# Altium footprint library WR-TBL_Pluggable PCB Header.PcbLib: 719 footprints (part 17 of 45)
Each footprint in its own frame and in the unit in brackets; x right, y up, seen from the top. Pads: shape width x height; smd on the part's side, far side on the other; paste and mask are expansions set on the pad; w line width, h text height; cw(c..) or ccw(c..) is an arc to the next point about the centre after c.
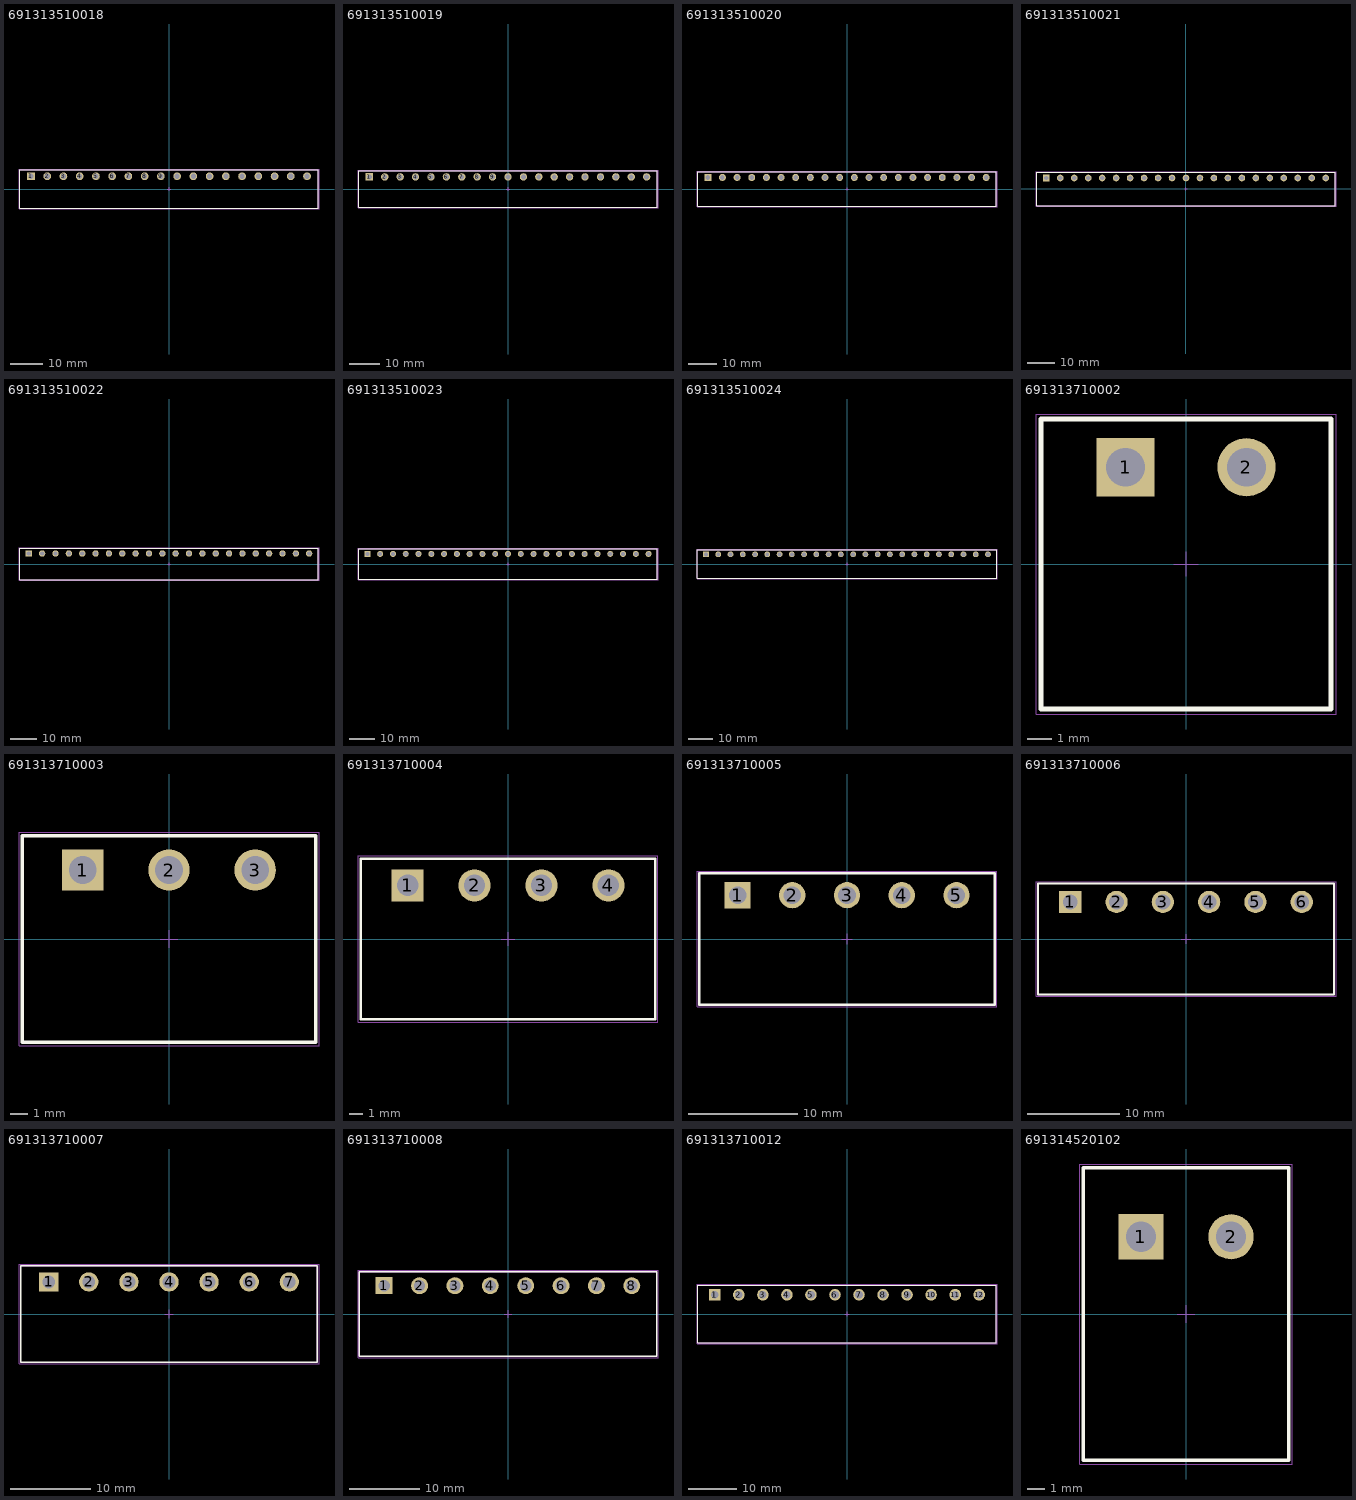
[diagram p16: the footprints below, top view; thin cyan lines are the x and y axes]

## 691313510018 [mm] "5,08mm - PCB Headers - Horizontal - Closed ends - 18p"
height 8.5
pads (18):
  rect 2.4x2.4 hole 1.6: 1(-43.18,4)
  round 2.4 hole 1.6: 2(-38.1,4) 3(-33.02,4) 4(-27.94,4) 5(-22.86,4) 6(-17.78,4) 7(-12.7,4) 8(-7.62,4) 9(-2.54,4) 10(2.54,4) 11(7.62,4) 12(12.7,4) 13(17.78,4) 14(22.86,4) 15(27.94,4) 16(33.02,4) 17(38.1,4) 18(43.18,4)
Top Overlay:
  lines w0.2: -46.72,-6 46.72,-6 46.72,6 -46.72,6 -46.72,-6
Mechanical 13:
  lines w0.1: -46.72,-6 -46.72,6 46.72,6 46.72,-6 -46.72,-6
Mechanical 15:
  lines w0.05: -0.5,0 0.5,0 ; 0,-0.5 0,0.5 ; -46.92,-6.2 46.92,-6.2 46.92,6.2 -46.92,6.2 -46.92,-6.2
3D body "691313510018.stp": height 8.55, standoff -3.45, extent -46.72,-6 46.72,6

## 691313510019 [mm] "5,08mm - PCB Headers - Horizontal - Closed ends - 19p"
height 8.5
pads (19):
  rect 2.4x2.4 hole 1.6: 1(-45.72,4)
  round 2.4 hole 1.6: 2(-40.64,4) 3(-35.56,4) 4(-30.48,4) 5(-25.4,4) 6(-20.32,4) 7(-15.24,4) 8(-10.16,4) 9(-5.08,4) 10(0,4) 11(5.08,4) 12(10.16,4) 13(15.24,4) 14(20.32,4) 15(25.4,4) 16(30.48,4) 17(35.56,4) 18(40.64,4) 19(45.72,4)
Top Overlay:
  lines w0.2: -49.26,-6 49.26,-6 49.26,6 -49.26,6 -49.26,-6
Mechanical 13:
  lines w0.1: -49.26,-6 -49.26,6 49.26,6 49.26,-6 -49.26,-6
Mechanical 15:
  lines w0.05: -0.5,0 0.5,0 ; 0,-0.5 0,0.5 ; -49.46,-6.2 49.46,-6.2 49.46,6.2 -49.46,6.2 -49.46,-6.2
3D body "691313510019.stp": height 8.55, standoff -3.45, extent -49.26,-6 49.26,6

## 691313510020 [mm] "5,08mm - PCB Headers - Horizontal - Closed ends - 20p"
height 8.5
pads (20):
  rect 2.4x2.4 hole 1.6: 1(-48.26,4)
  round 2.4 hole 1.6: 2(-43.18,4) 3(-38.1,4) 4(-33.02,4) 5(-27.94,4) 6(-22.86,4) 7(-17.78,4) 8(-12.7,4) 9(-7.62,4) 10(-2.54,4) 11(2.54,4) 12(7.62,4) 13(12.7,4) 14(17.78,4) 15(22.86,4) 16(27.94,4) 17(33.02,4) 18(38.1,4) 19(43.18,4) 20(48.26,4)
Top Overlay:
  lines w0.2: -51.8,-6 51.8,-6 51.8,6 -51.8,6 -51.8,-6
Mechanical 13:
  lines w0.1: -51.8,-6 -51.8,6 51.8,6 51.8,-6 -51.8,-6
Mechanical 15:
  lines w0.05: -0.5,0 0.5,0 ; 0,-0.5 0,0.5 ; -52,-6.2 52,-6.2 52,6.2 -52,6.2 -52,-6.2
3D body "691313510020.stp": height 8.55, standoff -3.45, extent -51.8,-6 51.8,6

## 691313510021 [mm] "5,08mm - PCB Headers - Horizontal - Closed ends - 21p"
height 8.5
pads (21):
  rect 2.4x2.4 hole 1.6: 1(-50.8,4)
  round 2.4 hole 1.6: 2(-45.72,4) 3(-40.64,4) 4(-35.56,4) 5(-30.48,4) 6(-25.4,4) 7(-20.32,4) 8(-15.24,4) 9(-10.16,4) 10(-5.08,4) 11(0,4) 12(5.08,4) 13(10.16,4) 14(15.24,4) 15(20.32,4) 16(25.4,4) 17(30.48,4) 18(35.56,4) 19(40.64,4) 20(45.72,4) 21(50.8,4)
Top Overlay:
  lines w0.2: -54.34,-6 54.34,-6 54.34,6 -54.34,6 -54.34,-6
Mechanical 13:
  lines w0.1: -54.34,-6 -54.34,6 54.34,6 54.34,-6 -54.34,-6
Mechanical 15:
  lines w0.05: -0.5,0 0.5,0 ; 0,-0.5 0,0.5 ; -54.54,-6.2 54.54,-6.2 54.54,6.2 -54.54,6.2 -54.54,-6.2
3D body "691313510021.stp": height 8.55, standoff -3.45, extent -54.34,-6 54.34,6

## 691313510022 [mm] "5,08mm - PCB Headers - Horizontal - Closed ends - 22p"
height 8.5
pads (22):
  rect 2.4x2.4 hole 1.6: 1(-53.34,4)
  round 2.4 hole 1.6: 2(-48.26,4) 3(-43.18,4) 4(-38.1,4) 5(-33.02,4) 6(-27.94,4) 7(-22.86,4) 8(-17.78,4) 9(-12.7,4) 10(-7.62,4) 11(-2.54,4) 12(2.54,4) 13(7.62,4) 14(12.7,4) 15(17.78,4) 16(22.86,4) 17(27.94,4) 18(33.02,4) 19(38.1,4) 20(43.18,4) 21(48.26,4) 22(53.34,4)
Top Overlay:
  lines w0.2: -56.88,-6 56.88,-6 56.88,6 -56.88,6 -56.88,-6
Mechanical 13:
  lines w0.1: -56.88,-6 -56.88,6 56.88,6 56.88,-6 -56.88,-6
Mechanical 15:
  lines w0.05: -0.5,0 0.5,0 ; 0,-0.5 0,0.5 ; -57.08,-6.2 57.08,-6.2 57.08,6.2 -57.08,6.2 -57.08,-6.2
3D body "691313510022.stp": height 8.55, standoff -3.45, extent -56.88,-6 56.88,6

## 691313510023 [mm] "5,08mm - PCB Headers - Horizontal - Closed ends -23p"
height 8.5
pads (23):
  rect 2.4x2.4 hole 1.6: 1(-55.88,4)
  round 2.4 hole 1.6: 2(-50.8,4) 3(-45.72,4) 4(-40.64,4) 5(-35.56,4) 6(-30.48,4) 7(-25.4,4) 8(-20.32,4) 9(-15.24,4) 10(-10.16,4) 11(-5.08,4) 12(0,4) 13(5.08,4) 14(10.16,4) 15(15.24,4) 16(20.32,4) 17(25.4,4) 18(30.48,4) 19(35.56,4) 20(40.64,4) 21(45.72,4) 22(50.8,4) 23(55.88,4)
Top Overlay:
  lines w0.2: -59.42,-6 -59.42,6 59.42,6 59.42,-6 -59.42,-6
Mechanical 13:
  lines w0.1: -59.42,-6 59.42,-6 59.42,6 -59.42,6 -59.42,-6
Mechanical 15:
  lines w0.05: -0.5,0 0.5,0 ; 0,-0.5 0,0.5 ; -59.62,-6.2 -59.62,6.2 59.62,6.2 59.62,-6.2 -59.62,-6.2
3D body "691313510023.stp": height 8.55, standoff -3.45, extent -59.42,-6 59.42,6

## 691313510024 [mm] "5,08mm - PCB Headers - Horizontal - Closed ends - 24p"
height 8.5
pads (24):
  rect 2.4x2.4 hole 1.6: 1(-58.42,4)
  round 2.4 hole 1.6: 2(-53.34,4) 3(-48.26,4) 4(-43.18,4) 5(-38.1,4) 6(-33.02,4) 7(-27.94,4) 8(-22.86,4) 9(-17.78,4) 10(-12.7,4) 11(-7.62,4) 12(-2.54,4) 13(2.54,4) 14(7.62,4) 15(12.7,4) 16(17.78,4) 17(22.86,4) 18(27.94,4) 19(33.02,4) 20(38.1,4) 21(43.18,4) 22(48.26,4) 23(53.34,4) 24(58.42,4)
Top Overlay:
  lines w0.2: -61.96,-6 61.96,-6 61.96,6 -61.96,6 -61.96,-6
Mechanical 13:
  lines w0.1: -61.96,-6 -61.96,6 61.96,6 61.96,-6 -61.96,-6
Mechanical 15:
  lines w0.05: -0.5,0 0.5,0 ; 0,-0.5 0,0.5 ; -62.16,-6.2 62.16,-6.2 62.16,6.2 -62.16,6.2 -62.16,-6.2
3D body "691313510024.stp": height 8.55, standoff -3.45, extent -61.96,-6 61.96,6

## 691313710002 [mm] "5.00mm - Closed Horizhontal PCB Header - -02p"
height 8.5
pads (2):
  rect 2.4x2.4 hole 1.6: 1(-2.5,4)
  round 2.4 hole 1.6: 2(2.5,4)
Top Overlay:
  lines w0.2: -6,-6 -6,6 6,6 6,-6 -6,-6
Mechanical 13:
  lines w0.1: -6,-6 6,-6 6,6 -6,6 -6,-6
Mechanical 15:
  lines w0.05: -0.5,0 0.5,0 ; 0,-0.5 0,0.5 ; -6.2,-6.2 6.2,-6.2 6.2,6.2 -6.2,6.2 -6.2,-6.2
3D body "691313710002.stp": height 8.55, standoff -3.45, extent -6,-6 6,6

## 691313710003 [mm] "5.00mm - Closed Horizhontal PCB Header - -03p"
height 8.5
pads (3):
  rect 2.4x2.4 hole 1.6: 1(-5,4)
  round 2.4 hole 1.6: 2(0,4) 3(5,4)
Top Overlay:
  lines w0.2: -8.5,-6 8.5,-6 8.5,6 -8.5,6 -8.5,-6
Mechanical 13:
  lines w0.1: -8.5,-6 -8.5,6 8.5,6 8.5,-6 -8.5,-6
Mechanical 15:
  lines w0.05: -0.5,0 0.5,0 ; 0,-0.5 0,0.5 ; -8.7,-6.2 -8.7,6.2 8.7,6.2 8.7,-6.2 -8.7,-6.2
3D body "691313710003.stp": height 8.55, standoff -3.45, extent -8.5,-6 8.5,6

## 691313710004 [mm] "5.00mm - Closed Horizhontal PCB Header - -04p"
height 8.5
pads (4):
  rect 2.4x2.4 hole 1.6: 1(-7.5,4)
  round 2.4 hole 1.6: 2(-2.5,4) 3(2.5,4) 4(7.5,4)
Top Overlay:
  lines w0.2: -11,-6 11,-6 11,6 -11,6 -11,-6
Mechanical 13:
  lines w0.1: -11,-6 -11,6 11,6 11,-6 -11,-6
Mechanical 15:
  lines w0.05: -0.5,0 0.5,0 ; 0,-0.5 0,0.5 ; -11.2,-6.2 -11.2,6.2 11.2,6.2 11.2,-6.2 -11.2,-6.2
3D body "691313710004.stp": height 8.55, standoff -3.45, extent -11,-6 11,6

## 691313710005 [mm] "5.00mm - Closed Horizhontal PCB Header - -05p"
height 8.5
pads (5):
  rect 2.4x2.4 hole 1.6: 1(-10,4)
  round 2.4 hole 1.6: 2(-5,4) 3(0,4) 4(5,4) 5(10,4)
Top Overlay:
  lines w0.2: -13.5,-6 13.5,-6 13.5,6 -13.5,6 -13.5,-6
Mechanical 13:
  lines w0.1: -13.5,-6 -13.5,6 13.5,6 13.5,-6 -13.5,-6
Mechanical 15:
  lines w0.05: -0.5,0 0.5,0 ; 0,-0.5 0,0.5 ; -13.7,-6.2 -13.7,6.2 13.7,6.2 13.7,-6.2 -13.7,-6.2
3D body "691313710005.stp": height 8.55, standoff -3.45, extent -13.5,-6 13.5,6

## 691313710006 [mm] "5.00mm - Closed Horizhontal PCB Header - -06p"
height 8.5
pads (6):
  rect 2.4x2.4 hole 1.6: 1(-12.5,4)
  round 2.4 hole 1.6: 2(-7.5,4) 3(-2.5,4) 4(2.5,4) 5(7.5,4) 6(12.5,4)
Top Overlay:
  lines w0.2: -16,-6 16,-6 16,6 -16,6 -16,-6
Mechanical 13:
  lines w0.1: -16,-6 -16,6 16,6 16,-6 -16,-6
Mechanical 15:
  lines w0.05: -0.5,0 0.5,0 ; 0,-0.5 0,0.5 ; -16.2,-6.2 -16.2,6.2 16.2,6.2 16.2,-6.2 -16.2,-6.2
3D body "691313710006.stp": height 8.55, standoff -3.45, extent -16,-6 16,6

## 691313710007 [mm] "5.00mm - Closed Horizhontal PCB Header - -07p"
height 8.5
pads (7):
  rect 2.4x2.4 hole 1.6: 1(-15,4)
  round 2.4 hole 1.6: 2(-10,4) 3(-5,4) 4(0,4) 5(5,4) 6(10,4) 7(15,4)
Top Overlay:
  lines w0.2: -18.5,-6 18.5,-6 18.5,6 -18.5,6 -18.5,-6
Mechanical 13:
  lines w0.1: -18.5,-6 -18.5,6 18.5,6 18.5,-6 -18.5,-6
Mechanical 15:
  lines w0.05: -0.5,0 0.5,0 ; 0,-0.5 0,0.5 ; -18.7,-6.2 -18.7,6.2 18.7,6.2 18.7,-6.2 -18.7,-6.2
3D body "691313710007.stp": height 8.55, standoff -3.45, extent -18.5,-6 18.5,6

## 691313710008 [mm] "5.00mm - Closed Horizhontal PCB Header - -08p"
height 8.5
pads (8):
  rect 2.4x2.4 hole 1.6: 1(-17.5,4)
  round 2.4 hole 1.6: 2(-12.5,4) 3(-7.5,4) 4(-2.5,4) 5(2.5,4) 6(7.5,4) 7(12.5,4) 8(17.5,4)
Top Overlay:
  lines w0.2: -21,-6 21,-6 21,6 -21,6 -21,-6
Mechanical 13:
  lines w0.1: -21,-6 -21,6 21,6 21,-6 -21,-6
Mechanical 15:
  lines w0.05: -0.5,0 0.5,0 ; 0,-0.5 0,0.5 ; -21.2,-6.2 -21.2,6.2 21.2,6.2 21.2,-6.2 -21.2,-6.2
3D body "691313710008.stp": height 8.55, standoff -3.45, extent -21,-6 21,6

## 691313710012 [mm] "5.00mm - Closed Horizhontal PCB Header - -12p"
height 8.5
pads (12):
  rect 2.4x2.4 hole 1.6: 1(-27.5,4)
  round 2.4 hole 1.6: 2(-22.5,4) 3(-17.5,4) 4(-12.5,4) 5(-7.5,4) 6(-2.5,4) 7(2.5,4) 8(7.5,4) 9(12.5,4) 10(17.5,4) 11(22.5,4) 12(27.5,4)
Top Overlay:
  lines w0.2: -31,-6 -31,6 31,6 31,-6 -31,-6
Mechanical 13:
  lines w0.1: -31,-6 31,-6 31,6 -31,6 -31,-6
Mechanical 15:
  lines w0.05: -0.5,0 0.5,0 ; 0,-0.5 0,0.5 ; -31.2,-6.2 31.2,-6.2 31.2,6.2 -31.2,6.2 -31.2,-6.2
3D body "691313710012.stp": height 8.55, standoff -3.45, extent -31,-6 31,6

## 691314520102 [mm] "5,08mm - PCB Headers - 45°- 02p"
height 14.5
pads (2):
  rect 2.55x2.55 hole 1.7: 1(-2.54,4.35)
  round 2.55 hole 1.7: 2(2.54,4.35)
Top Overlay:
  lines w0.2: -5.78,-8.25 5.78,-8.25 5.78,8.25 -5.78,8.25 -5.78,-8.25
Mechanical 13:
  lines w0.1: -5.78,-8.25 -5.78,8.25 5.78,8.25 5.78,-8.25 -5.78,-8.25
Mechanical 15:
  lines w0.05: -0.5,0 0.5,0 ; 0,-0.5 0,0.5 ; -5.98,-8.45 -5.98,8.45 5.98,8.45 5.98,-8.45 -5.98,-8.45
3D body "691314520102.stp": height 14.55, standoff -4.05, extent -5.78,-8.25 5.78,8.25